# Altium footprint library PcbLib1.PcbLib: 13 footprints
Each footprint in its own frame and in the unit in brackets; x right, y up, seen from the top. Pads: shape width x height; smd on the part's side, far side on the other; paste and mask are expansions set on the pad; w line width, h text height; cw(c..) or ccw(c..) is an arc to the next point about the centre after c.
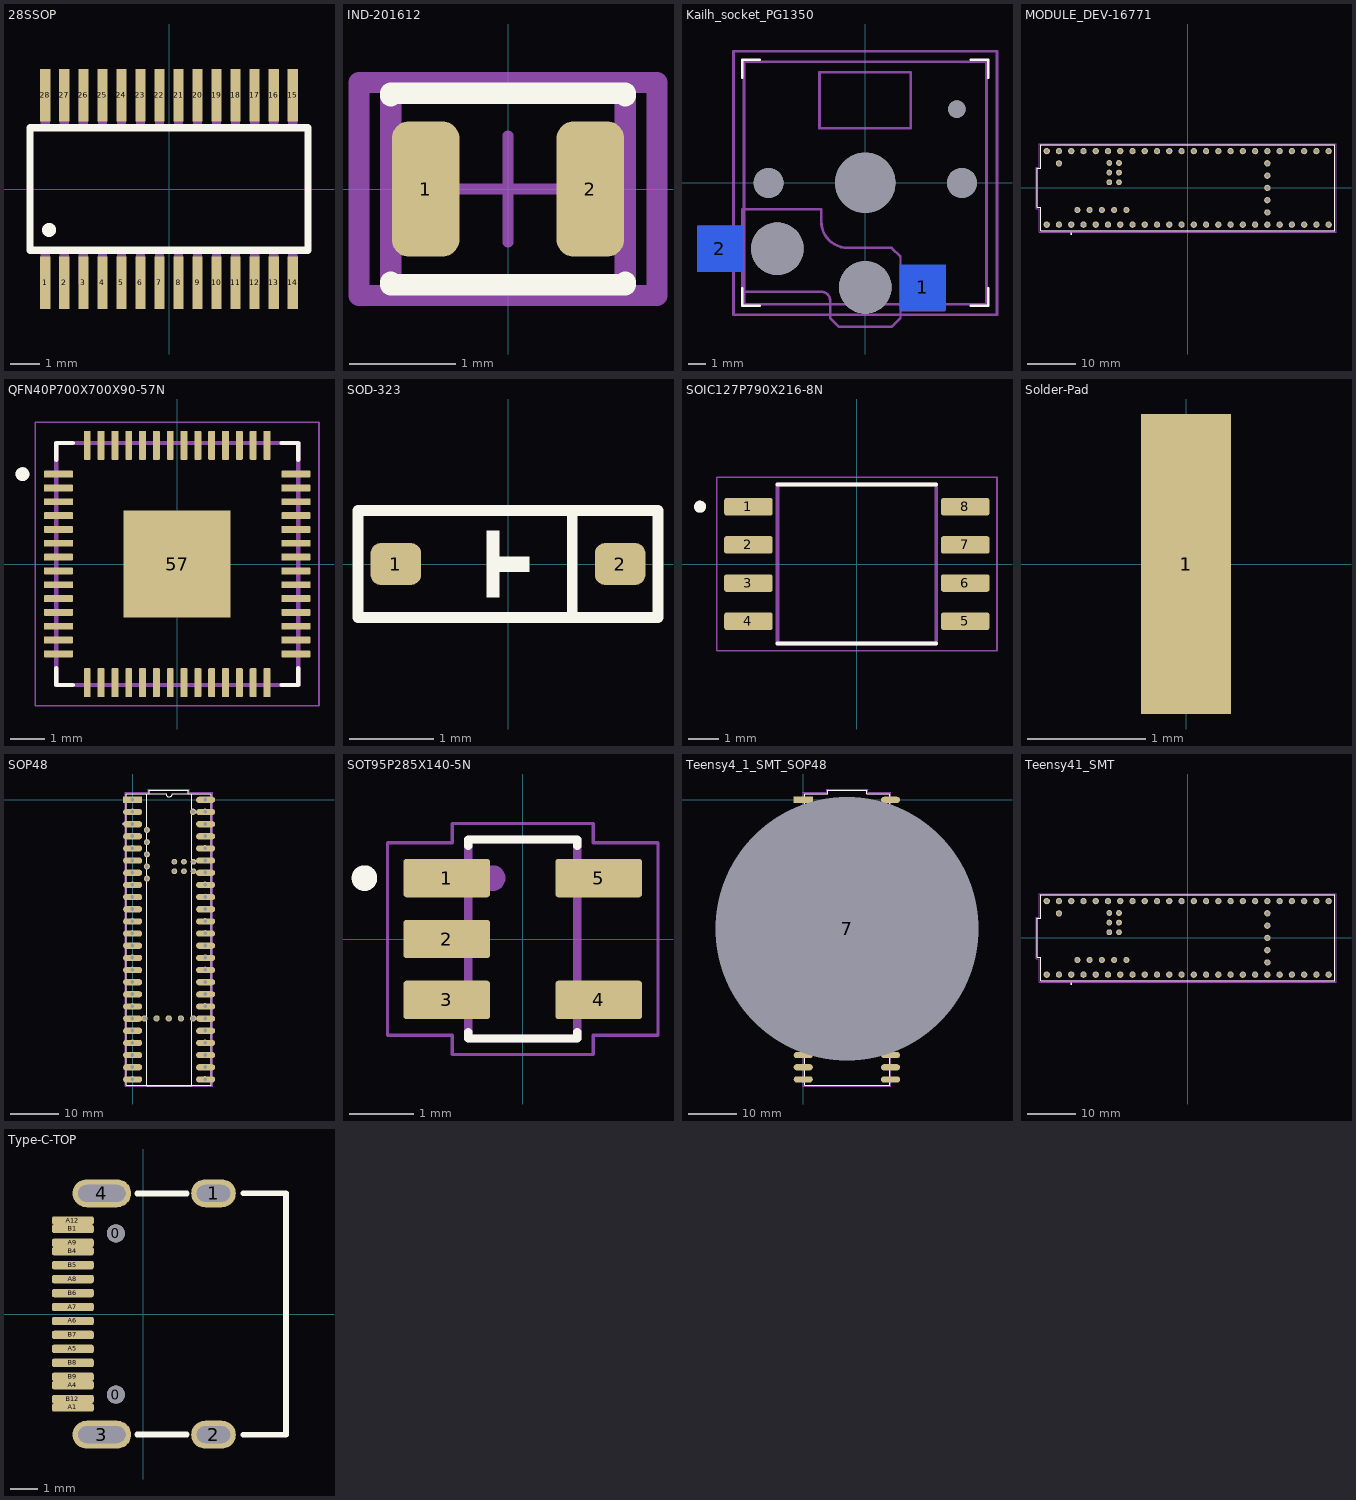
[diagram p0: the footprints below, top view; thin cyan lines are the x and y axes]

## 28SSOP [mm]
pads (28):
  rect 0.35x1.8 smd: 1(-4.225,-3.2) 2(-3.575,-3.2) 3(-2.925,-3.2) 4(-2.275,-3.2) 5(-1.625,-3.2) 6(-0.975,-3.2) 7(-0.325,-3.2) 8(0.325,-3.2) 9(0.975,-3.2) 10(1.625,-3.2) 11(2.275,-3.2) 12(2.925,-3.2) 13(3.575,-3.2) 14(4.225,-3.2) 15(4.225,3.2) 16(3.575,3.2) 17(2.925,3.2) 18(2.275,3.2) 19(1.625,3.2) 20(0.975,3.2) 21(0.325,3.2) 22(-0.325,3.2) 23(-0.975,3.2) 24(-1.625,3.2) 25(-2.275,3.2) 26(-2.925,3.2) 27(-3.575,3.2) 28(-4.225,3.2)
Top Overlay:
  circle w0.254: c-4.1,-1.4 r0.112
  lines w0.254: -4.75,-2.1 4.75,-2.1 4.75,2.1 -4.75,2.1 -4.75,-2.1
Mechanical 13:
  region: -4.075,-3.25 -4.375,-3.25 -4.375,-2.2 -4.075,-2.2
  region: -3.425,-3.25 -3.725,-3.25 -3.725,-2.2 -3.425,-2.2
  region: -2.775,-3.25 -3.075,-3.25 -3.075,-2.2 -2.775,-2.2
  region: -2.125,-3.25 -2.425,-3.25 -2.425,-2.2 -2.125,-2.2
  region: -1.475,-3.25 -1.775,-3.25 -1.775,-2.2 -1.475,-2.2
  region: -0.825,-3.25 -1.125,-3.25 -1.125,-2.2 -0.825,-2.2
  region: -0.175,-3.25 -0.475,-3.25 -0.475,-2.2 -0.175,-2.2
  region: 0.475,-3.25 0.175,-3.25 0.175,-2.2 0.475,-2.2
  region: 1.125,-3.25 0.825,-3.25 0.825,-2.2 1.125,-2.2
  region: 1.775,-3.25 1.475,-3.25 1.475,-2.2 1.775,-2.2
  region: 2.425,-3.25 2.125,-3.25 2.125,-2.2 2.425,-2.2
  region: 3.075,-3.25 2.775,-3.25 2.775,-2.2 3.075,-2.2
  region: 3.725,-3.25 3.425,-3.25 3.425,-2.2 3.725,-2.2
  region: 4.375,-3.25 4.075,-3.25 4.075,-2.2 4.375,-2.2
  region: 4.375,2.2 4.075,2.2 4.075,3.25 4.375,3.25
  region: 3.725,2.2 3.425,2.2 3.425,3.25 3.725,3.25
  region: 3.075,2.2 2.775,2.2 2.775,3.25 3.075,3.25
  region: 2.425,2.2 2.125,2.2 2.125,3.25 2.425,3.25
  region: 1.775,2.2 1.475,2.2 1.475,3.25 1.775,3.25
  region: 1.125,2.2 0.825,2.2 0.825,3.25 1.125,3.25
  region: 0.475,2.2 0.175,2.2 0.175,3.25 0.475,3.25
  region: -0.175,2.2 -0.475,2.2 -0.475,3.25 -0.175,3.25
  region: -0.825,2.2 -1.125,2.2 -1.125,3.25 -0.825,3.25
  region: -1.475,2.2 -1.775,2.2 -1.775,3.25 -1.475,3.25
  region: -2.125,2.2 -2.425,2.2 -2.425,3.25 -2.125,3.25
  region: -2.775,2.2 -3.075,2.2 -3.075,3.25 -2.775,3.25
  region: -3.425,2.2 -3.725,2.2 -3.725,3.25 -3.425,3.25
  region: -4.075,2.2 -4.375,2.2 -4.375,3.25 -4.075,3.25

## IND-201612 [mm]
pads (2):
  rrect50% 0.635x1.27 smd paste+0 mask+0: 1(-0.774,0) 2(0.774,0)
Top Overlay:
  lines w0.2: -1.1,-0.875 -1.1,-0.9 1.1,-0.9 1.1,-0.875 ; -1.1,0.875 -1.1,0.9 1.1,0.9 1.1,0.875
Mechanical 10:
  lines w0.2: -1.4,-1 1.4,-1 1.4,1 -1.4,1 -1.4,-1
Mechanical 12:
  lines w0.2: -1.1,-0.9 1.1,-0.9 1.1,0.9 -1.1,0.9 -1.1,-0.9
Mechanical 15:
  lines w0.1: -0.5,0 0.5,0 ; 0,-0.5 0,0.5
  lines w0.2: -1.4,-1 1.4,-1 1.4,1 -1.4,1 -1.4,-1
3D body "Ind_Murata.step": height 0.95, standoff 0, extent -1,-0.8 1,0.8

## Kailh_socket_PG1350 [mil]
pads (8):
  rect 102.36x102.36 smd far side paste+0 mask+2: 1(128.94,-234.25) 2(-325.79,-147.64)
  round 67 hole 67 unplated paste+0: ""(-216.54,0) ""(216.54,0)
  round 118.1 hole 118.1 unplated paste+0: ""(-196.85,-147.64) ""(0,-234.25)
  round 135 hole 135 unplated paste+0: ""(0,0)
  round 39 hole 39 unplated paste+0: ""(205.51,165.35)
Top Overlay:
  lines w5.91: -275.59,-236.22 -275.59,-275.59 -236.22,-275.59 ; -275.59,236.22 -275.59,275.59 -236.22,275.59 ; 236.22,275.59 275.59,275.59 275.59,236.22 ; 275.59,-236.22 275.59,-275.59 ; 275.59,-275.59 236.22,-275.59 275.59,-275.59
Bottom Overlay:
  lines w5.91: -275.59,-220.47 -275.59,-244.09 -98.42,-244.09 cw(c-98.42,-263.77) -78.74,-263.78 -78.74,-303.15 -59.06,-322.83 59.06,-322.83 78.74,-303.15 ; -275.59,-78.74 -275.59,-59.06 -98.42,-59.06 -98.42,-86.61 ; -98.43,-86.61 ccw(c-39.38,-86.62) -39.37,-145.67 59.06,-145.67 78.74,-165.35
Mechanical 15:
  lines w4.72: -275.59,-244.09 -275.59,-59.06 ; -275.59,-196.85 -374.01,-196.85 -374.01,-98.42 -275.59,-98.42 ; 78.74,-303.15 78.74,-167.32 ; 78.74,-285.43 177.16,-285.43 177.16,-187.01 78.74,-187.01
  lines w5.91: -275.59,-244.09 -98.42,-244.09 cw(c-98.42,-263.77) -78.74,-263.78 -78.74,-303.15 -59.06,-322.83 59.06,-322.83 78.74,-303.15 ; -275.59,-59.06 -98.42,-59.06 -98.42,-86.61 ; -98.43,-86.61 ccw(c-39.38,-86.62) -39.37,-145.67 59.06,-145.67 78.74,-165.35 ; -295.27,-295.27 -295.27,295.27 295.27,295.27 295.27,-295.27 -295.27,-295.27 ; -271.65,-271.65 271.65,-271.65 271.65,271.65 -271.65,271.65 -271.65,-271.65 ; -102.36,122.05 102.36,122.05 102.36,248.03 -102.36,248.03 -102.36,122.05
  text "REF" at -70.87,-177.16 h39.37
3D body "Key_ASEM v3.step": height 410.79, standoff -95.23, extent -353.29,-352.36 345.09,352.37

## MODULE_DEV-16771 [mm]
height 4.07
pads (65):
  round 1.308 hole 0.8: 0(-26.67,-7.62) 1(-24.13,-7.62) 2(-21.59,-7.62) 3(-19.05,-7.62) 3.3V_1(6.35,-7.62) 3.3V_2(-24.13,7.62) 3.3V_3(16.51,-2.54) 4(-16.51,-7.62) 5(-13.97,-7.62) 6(-11.43,-7.62) 7(-8.89,-7.62) 8(-6.35,-7.62) 9(-3.81,-7.62) 10(-1.27,-7.62) 11(1.27,-7.62) 12(3.81,-7.62) 13(3.81,7.62) 14(1.27,7.62) 15(-1.27,7.62) 16(-3.81,7.62) 17(-6.35,7.62) 18(-8.89,7.62) 19(-11.43,7.62) 20(-13.97,7.62) 21(-16.51,7.62) 22(-19.05,7.62) 23(-21.59,7.62) 24(8.89,-7.62) 25(11.43,-7.62) 26(13.97,-7.62) 27(16.51,-7.62) 28(19.05,-7.62) 29(21.59,-7.62) 30(24.13,-7.62) 31(26.67,-7.62) 32(29.21,-7.62) 33(29.21,7.62) 34(26.67,7.62) 35(24.13,7.62) 36(21.59,7.62) 37(19.05,7.62) 38(16.51,7.62) 39(13.97,7.62) 40(11.43,7.62) 41(8.89,7.62) GND1(-29.21,-7.62) GND2(6.35,7.62) GND3(-26.67,7.62) GND4(16.51,0) ON/OFF(16.51,5.08) PROGRAM(16.51,2.54) VBAT(16.51,-5.08) VIN(-29.21,7.62) VUSB(-26.67,5.08)
  round 1.258 hole 0.75: 5V(-22.86,-4.57) D+(-17.78,-4.57) D-(-20.32,-4.57) USB_GND1(-15.24,-4.57) USB_GND2(-12.7,-4.57)
  round 1.208 hole 0.7: GND5(-14.24,3.17) LED(-16.24,3.17) R+(-16.24,5.17) R-(-14.24,5.17) T+(-14.24,1.17) T-(-16.24,1.17)
Top Overlay:
  circle w0.2: c-24.13,-9.5 r0.1
  lines w0.127: -31.18,-4.03 -31.18,4.03 -30.48,4.03 -30.48,8.89 30.48,8.89 30.48,-8.89 -30.48,-8.89 -30.48,-4.03 -31.18,-4.03
Mechanical 13:
  circle w0.2: c-24.13,-9.5 r0.1
  lines w0.127: -31.18,-4.03 -31.18,4.03 -30.48,4.03 -30.48,8.89 30.48,8.89 30.48,-8.89 -30.48,-8.89 -30.48,-4.03 -31.18,-4.03
  text "Teensy 4.1" at -0.25,0.34 h1.27
Mechanical 15:
  lines w0.05: -31.43,-4.28 -31.43,4.28 -30.73,4.28 -30.73,9.14 30.73,9.14 30.73,-9.14 -30.73,-9.14 -30.73,-4.28 -31.43,-4.28
3D body "step_temp.STEP": height 7.15, standoff -6.7, extent -31.18,-8.89 30.48,8.89

## QFN40P700X700X90-57N [mm]
height 0.9
pads (57):
  rrect25% 0.84x0.2 smd: 1(-3.435,2.6) 2(-3.435,2.2) 3(-3.435,1.8) 4(-3.435,1.4) 5(-3.435,1) 6(-3.435,0.6) 7(-3.435,0.2) 8(-3.435,-0.2) 9(-3.435,-0.6) 10(-3.435,-1) 11(-3.435,-1.4) 12(-3.435,-1.8) 13(-3.435,-2.2) 14(-3.435,-2.6) 29(3.435,-2.6) 30(3.435,-2.2) 31(3.435,-1.8) 32(3.435,-1.4) 33(3.435,-1) 34(3.435,-0.6) 35(3.435,-0.2) 36(3.435,0.2) 37(3.435,0.6) 38(3.435,1) 39(3.435,1.4) 40(3.435,1.8) 41(3.435,2.2) 42(3.435,2.6)
  rrect25% 0.2x0.84 smd: 15(-2.6,-3.435) 16(-2.2,-3.435) 17(-1.8,-3.435) 18(-1.4,-3.435) 19(-1,-3.435) 20(-0.6,-3.435) 21(-0.2,-3.435) 22(0.2,-3.435) 23(0.6,-3.435) 24(1,-3.435) 25(1.4,-3.435) 26(1.8,-3.435) 27(2.2,-3.435) 28(2.6,-3.435) 43(2.6,3.435) 44(2.2,3.435) 45(1.8,3.435) 46(1.4,3.435) 47(1,3.435) 48(0.6,3.435) 49(0.2,3.435) 50(-0.2,3.435) 51(-0.6,3.435) 52(-1,3.435) 53(-1.4,3.435) 54(-1.8,3.435) 55(-2.2,3.435) 56(-2.6,3.435)
  rect 3.1x3.1 smd paste-0.57: 57(0,0)
Top Overlay:
  circle w0.2: c-4.475,2.6 r0.1
  lines w0.127: -3.5,-3.02 -3.5,-3.5 -3.02,-3.5 ; -3.5,3.02 -3.5,3.5 -3.02,3.5 ; 3.02,-3.5 3.5,-3.5 3.5,-3.02 ; 3.02,3.5 3.5,3.5 3.5,3.02
Mechanical 13:
  circle w0.2: c-4.475,2.6 r0.1
  lines w0.127: -3.5,-3.5 3.5,-3.5 3.5,3.5 -3.5,3.5 -3.5,-3.5
Mechanical 15:
  lines w0.05: -4.105,-4.105 4.105,-4.105 4.105,4.105 -4.105,4.105 -4.105,-4.105
3D body "step_temp.STEP": height 0.9, standoff 0, extent -3.5,-3.5 3.5,3.5

## SOD-323 [mm]
pads (2):
  rrect50% 0.6x0.5 smd: 1(-1.329,0) 2(1.329,0)
Top Overlay:
  region: -0.254,0.394 -0.102,0.394 -0.102,0.089 0.254,0.089 0.254,-0.089 -0.102,-0.089 -0.102,-0.394 -0.254,-0.394
  lines w0.127: 0.762,-0.635 0.762,0.635 ; -1.778,-0.635 -1.778,0.635 1.778,0.635 1.778,-0.635 -1.778,-0.635
3D body "SW3dPS-SOD-323.STEP": height 1.15, standoff 0.05, extent -1.3,-0.675 1.3,0.675

## SOIC127P790X216-8N [mm]
pads (8):
  rrect25% 1.61x0.58 smd: 1(-3.605,1.905) 2(-3.605,0.635) 3(-3.605,-0.635) 4(-3.605,-1.905) 5(3.605,-1.905) 6(3.605,-0.635) 7(3.605,0.635) 8(3.605,1.905)
Top Overlay:
  circle w0.2: c-5.215,1.905 r0.1
  lines w0.127: -2.64,-2.64 2.64,-2.64 ; -2.64,2.64 2.64,2.64
Mechanical 13:
  circle w0.2: c-5.215,1.905 r0.1
  lines w0.127: -2.64,-2.64 2.64,-2.64 2.64,2.64 -2.64,2.64 -2.64,-2.64
Mechanical 15:
  lines w0.05: -4.66,-2.89 4.66,-2.89 4.66,2.89 -4.66,2.89 -4.66,-2.89

## Solder-Pad [mil]
pads (2):
  rect 30x100 on Top Solder: 1(0,0)
  rect 30x100 smd: 1(0,0)

## SOP48 [mm]
pads (113):
  round 1.308 hole 0.8: 0(-0.08,-2.492) 1(-0.08,-5.032) 2(-0.08,-7.572) 3(-0.08,-10.112) 3.3V_1(-0.08,-35.512) 3.3V_2(15.16,-5.032) 3.3V_3(5,-45.672) 4(-0.08,-12.652) 5(-0.08,-15.192) 6(-0.08,-17.732) 7(-0.08,-20.272) 8(-0.08,-22.812) 9(-0.08,-25.352) 10(-0.08,-27.892) 11(-0.08,-30.432) 12(-0.08,-32.972) 13(15.16,-32.972) 14(15.16,-30.432) 15(15.16,-27.892) 16(15.16,-25.352) 17(15.16,-22.812) 18(15.16,-20.272) 19(15.16,-17.732) 20(15.16,-15.192) 21(15.16,-12.652) 22(15.16,-10.112) 23(15.16,-7.572) 24(-0.08,-38.052) 25(-0.08,-40.592) 26(-0.08,-43.132) 27(-0.08,-45.672) 28(-0.08,-48.212) 29(-0.08,-50.752) 30(-0.08,-53.292) 31(-0.08,-55.832) 32(-0.08,-58.372) 33(15.16,-58.372) 34(15.16,-55.832) 35(15.16,-53.292) 36(15.16,-50.752) 37(15.16,-48.212) 38(15.16,-45.672) 39(15.16,-43.132) 40(15.16,-40.592) 41(15.16,-38.052) GND1(-0.08,0.048) GND2(15.16,-35.512) GND3(15.16,-2.492) GND4(7.54,-45.672) ON/OFF(12.62,-45.672) PROGRAM(10.08,-45.672) VBAT(2.46,-45.672) VIN(15.16,0.048) VUSB(12.62,-2.492)
  rect 4x1.3 smd: 1(0,0)
  oval 4x1.3 smd: 2(0,-2.54) 3(0,-5.08) 4(0,-7.62) 5(0,-10.16) 6(0,-12.7) 7(0,-15.24) 8(0,-17.78) 9(0,-20.32) 10(0,-22.86) 11(0,-25.4) 12(0,-27.94) 13(0,-30.48) 14(0,-33.02) 15(0,-35.56) 16(0,-38.1) 17(0,-40.64) 18(0,-43.18) 19(0,-45.72) 20(0,-48.26) 21(0,-50.8) 22(0,-53.34) 23(0,-55.88) 24(0,-58.42) 25(15.24,-58.42) 26(15.24,-55.88) 27(15.24,-53.34) 28(15.24,-50.8) 29(15.24,-48.26) 30(15.24,-45.72) 31(15.24,-43.18) 32(15.24,-40.64) 33(15.24,-38.1) 34(15.24,-35.56) 35(15.24,-33.02) 36(15.24,-30.48) 37(15.24,-27.94) 38(15.24,-25.4) 39(15.24,-22.86) 40(15.24,-20.32) 41(15.24,-17.78) 42(15.24,-15.24) 43(15.24,-12.7) 44(15.24,-10.16) 45(15.24,-7.62) 46(15.24,-5.08) 47(15.24,-2.54) 48(15.24,0)
  round 1.258 hole 0.75: 5V(2.97,-6.302) D+(2.97,-11.382) D-(2.97,-8.842) USB_GND1(2.97,-13.922) USB_GND2(2.97,-16.462)
  round 1.208 hole 0.7: GND5(10.71,-14.922) LED(10.71,-12.922) R+(12.71,-12.922) R-(12.71,-14.922) T+(8.71,-14.922) T-(8.71,-12.922)
Top Overlay:
  circle w0.2: c-1.96,-5.032 r0.1
  lines w0.127: -1.35,-59.642 -1.35,1.318 3.51,1.318 3.51,2.018 11.57,2.018 11.57,1.318 16.43,1.318 16.43,-59.642 -1.35,-59.642
  lines w0.254: 2.889,-59.69 12.351,-59.69 12.351,1.27 8.255,1.27 cw(c7.62,1.27) 6.985,1.27 2.889,1.27 2.889,-59.69
Mechanical 13:
  circle w0.2: c-1.96,-5.032 r0.1
  lines w0.127: -1.35,-59.642 -1.35,1.318 3.51,1.318 3.51,2.018 11.57,2.018 11.57,1.318 16.43,1.318 16.43,-59.642 -1.35,-59.642
  text "Teensy 4.1" at 7.88,-28.912 h1.27
Mechanical 15:
  lines w0.05: -1.6,-59.892 -1.6,1.568 3.26,1.568 3.26,2.268 11.82,2.268 11.82,1.568 16.68,1.568 16.68,-59.892 -1.6,-59.892
3D body "step_temp.STEP": height 7.15, standoff -6.7, extent -1.35,-59.642 16.43,2.018

## SOT95P285X140-5N [mm]
pads (5):
  rrect15% 1.35x0.6 smd: 1(-1.185,0.95) 2(-1.185,0) 3(-1.185,-0.95) 4(1.185,-0.95) 5(1.185,0.95)
Top Overlay:
  circle w0.2: c-2.469,0.95 r0.1
  lines w0.127: -0.85,-1.45 -0.85,-1.55 0.85,-1.55 0.85,-1.45 ; -0.85,1.45 -0.85,1.55 0.85,1.55 0.85,1.45
Mechanical 13:
  circle w0.2: c-0.469,0.95 r0.1
  lines w0.127: -0.85,-1.55 -0.85,1.55 0.85,1.55 0.85,-1.55 -0.85,-1.55
Mechanical 15:
  lines w0.05: -2.11,-1.5 -1.1,-1.5 -1.1,-1.8 1.1,-1.8 1.1,-1.5 2.11,-1.5 2.11,1.5 1.1,1.5 1.1,1.8 -1.1,1.8 -1.1,1.5 -2.11,1.5 -2.11,-1.5
3D body "step_temp.STEP": height 1.4, standoff 0, extent -1.5,-1.4 1.5,1.4

## Teensy4_1_SMT_SOP48 [mm]
pads (49):
  rect 4x1.3 smd: 1(0,0)
  oval 4x1.3 smd: 2(0,-2.54) 3(0,-5.08) 4(0,-7.62) 5(0,-10.16) 6(0,-12.7) 7(0,-15.24) 8(0,-17.78) 9(0,-20.32) 10(0,-22.86) 11(0,-25.4) 12(0,-27.94) 13(0,-30.48) 14(0,-33.02) 15(0,-35.56) 16(0,-38.1) 17(0,-40.64) 18(0,-43.18) 19(0,-45.72) 20(0,-48.26) 21(0,-50.8) 22(0,-53.34) 23(0,-55.88) 24(0,-58.42) 25(18.24,-58.42) 26(18.24,-55.88) 27(18.24,-53.34) 28(18.24,-50.8) 29(18.24,-48.26) 30(18.24,-45.72) 31(18.24,-43.18) 32(18.24,-40.64) 33(18.24,-38.1) 34(18.24,-35.56) 35(18.24,-33.02) 36(18.24,-30.48) 37(18.24,-27.94) 38(18.24,-25.4) 39(18.24,-22.86) 40(18.24,-20.32) 41(18.24,-17.78) 42(18.24,-15.24) 43(18.24,-12.7) 44(18.24,-10.16) 45(18.24,-7.62) 46(18.24,-5.08) 47(18.24,-2.54) 48(18.24,0)
  rect 12.5x12.5 hole 55 square unplated: 7(9.144,-26.924)
Top Overlay:
  circle w0.2: c-0.309,-5.032 r0.1
  lines w0.127: 0.301,-59.642 18.081,-59.642 18.081,1.318 13.221,1.318 13.221,2.018 5.161,2.018 5.161,1.318 0.301,1.318 0.301,-59.642
Mechanical 13:
  circle w0.2: c-0.309,-5.032 r0.1
  lines w0.127: 0.301,-59.642 18.081,-59.642 18.081,1.318 13.221,1.318 13.221,2.018 5.161,2.018 5.161,1.318 0.301,1.318 0.301,-59.642
  text "Teensy 4.1" at 3.937,2.921 h1.27
Mechanical 15:
  lines w0.05: 0.051,-59.892 18.331,-59.892 18.331,1.568 13.471,1.568 13.471,2.268 4.911,2.268 4.911,1.568 0.051,1.568 0.051,-59.892
3D body "Teensy 4.1 v2.step": height 4.27, standoff -0.99, extent 0.254,-59.854 18.034,2.032

## Teensy41_SMT [mm]
height 4.07
pads (65):
  round 1.308 hole 0.8: 0(-26.67,-7.62) 1(-24.13,-7.62) 2(-21.59,-7.62) 3(-19.05,-7.62) 3.3V_1(6.35,-7.62) 3.3V_2(-24.13,7.62) 3.3V_3(16.51,-2.54) 4(-16.51,-7.62) 5(-13.97,-7.62) 6(-11.43,-7.62) 7(-8.89,-7.62) 8(-6.35,-7.62) 9(-3.81,-7.62) 10(-1.27,-7.62) 11(1.27,-7.62) 12(3.81,-7.62) 13(3.81,7.62) 14(1.27,7.62) 15(-1.27,7.62) 16(-3.81,7.62) 17(-6.35,7.62) 18(-8.89,7.62) 19(-11.43,7.62) 20(-13.97,7.62) 21(-16.51,7.62) 22(-19.05,7.62) 23(-21.59,7.62) 24(8.89,-7.62) 25(11.43,-7.62) 26(13.97,-7.62) 27(16.51,-7.62) 28(19.05,-7.62) 29(21.59,-7.62) 30(24.13,-7.62) 31(26.67,-7.62) 32(29.21,-7.62) 33(29.21,7.62) 34(26.67,7.62) 35(24.13,7.62) 36(21.59,7.62) 37(19.05,7.62) 38(16.51,7.62) 39(13.97,7.62) 40(11.43,7.62) 41(8.89,7.62) GND1(-29.21,-7.62) GND2(6.35,7.62) GND3(-26.67,7.62) GND4(16.51,0) ON/OFF(16.51,5.08) PROGRAM(16.51,2.54) VBAT(16.51,-5.08) VIN(-29.21,7.62) VUSB(-26.67,5.08)
  round 1.258 hole 0.75: 5V(-22.86,-4.57) D+(-17.78,-4.57) D-(-20.32,-4.57) USB_GND1(-15.24,-4.57) USB_GND2(-12.7,-4.57)
  round 1.208 hole 0.7: GND5(-14.24,3.17) LED(-16.24,3.17) R+(-16.24,5.17) R-(-14.24,5.17) T+(-14.24,1.17) T-(-16.24,1.17)
Top Overlay:
  circle w0.2: c-24.13,-9.5 r0.1
  lines w0.127: -31.18,-4.03 -31.18,4.03 -30.48,4.03 -30.48,8.89 30.48,8.89 30.48,-8.89 -30.48,-8.89 -30.48,-4.03 -31.18,-4.03
Mechanical 13:
  circle w0.2: c-24.13,-9.5 r0.1
  lines w0.127: -31.18,-4.03 -31.18,4.03 -30.48,4.03 -30.48,8.89 30.48,8.89 30.48,-8.89 -30.48,-8.89 -30.48,-4.03 -31.18,-4.03
  text "Teensy 4.1" at -0.25,0.34 h1.27
Mechanical 15:
  lines w0.05: -31.43,-4.28 -31.43,4.28 -30.73,4.28 -30.73,9.14 30.73,9.14 30.73,-9.14 -30.73,-9.14 -30.73,-4.28 -31.43,-4.28
3D body "step_temp.STEP": height 7.15, standoff -6.7, extent -31.18,-8.89 30.48,8.89

## Type-C-TOP [mm]
height 4.3
pads (22):
  round 0.65 hole 0.65: 0(-0.98,-2.89) 0(-0.98,2.89)
  oval 1.6x1 hole 0.6 slot 1.2 at 0 deg: 1(2.52,4.325) 2(2.52,-4.325)
  oval 2.1x1 hole 0.6 slot 1.7 at 0 deg: 3(-1.48,-4.325) 4(-1.48,4.325)
  rrect50% 1.5x0.3 smd: A1(-2.52,-3.35) A4(-2.52,-2.55) A5(-2.52,-1.25) A6(-2.52,-0.25) A7(-2.52,0.25) A8(-2.52,1.25) A9(-2.52,2.55) A12(-2.52,3.35) B1(-2.52,3.05) B4(-2.52,2.25) B5(-2.52,1.75) B6(-2.52,0.75) B7(-2.52,-0.75) B8(-2.52,-1.75) B9(-2.52,-2.25) B12(-2.52,-3.05)
Top Overlay:
  lines w0.203: -0.218,-4.318 1.56,-4.318 ; -0.218,4.318 1.56,4.318 ; 3.592,-4.325 5.12,-4.325 5.12,4.325 3.592,4.325
3D body "1.step": height 3.26, standoff -1, extent -2.568,-4.475 5.182,4.475